# Altium footprint library ESKDPcbLib.PcbLib: 608 footprints (part 31 of 38)
Each footprint in its own frame and in the unit in brackets; x right, y up, seen from the top. Pads: shape width x height; smd on the part's side, far side on the other; paste and mask are expansions set on the pad; w line width, h text height; cw(c..) or ccw(c..) is an arc to the next point about the centre after c.
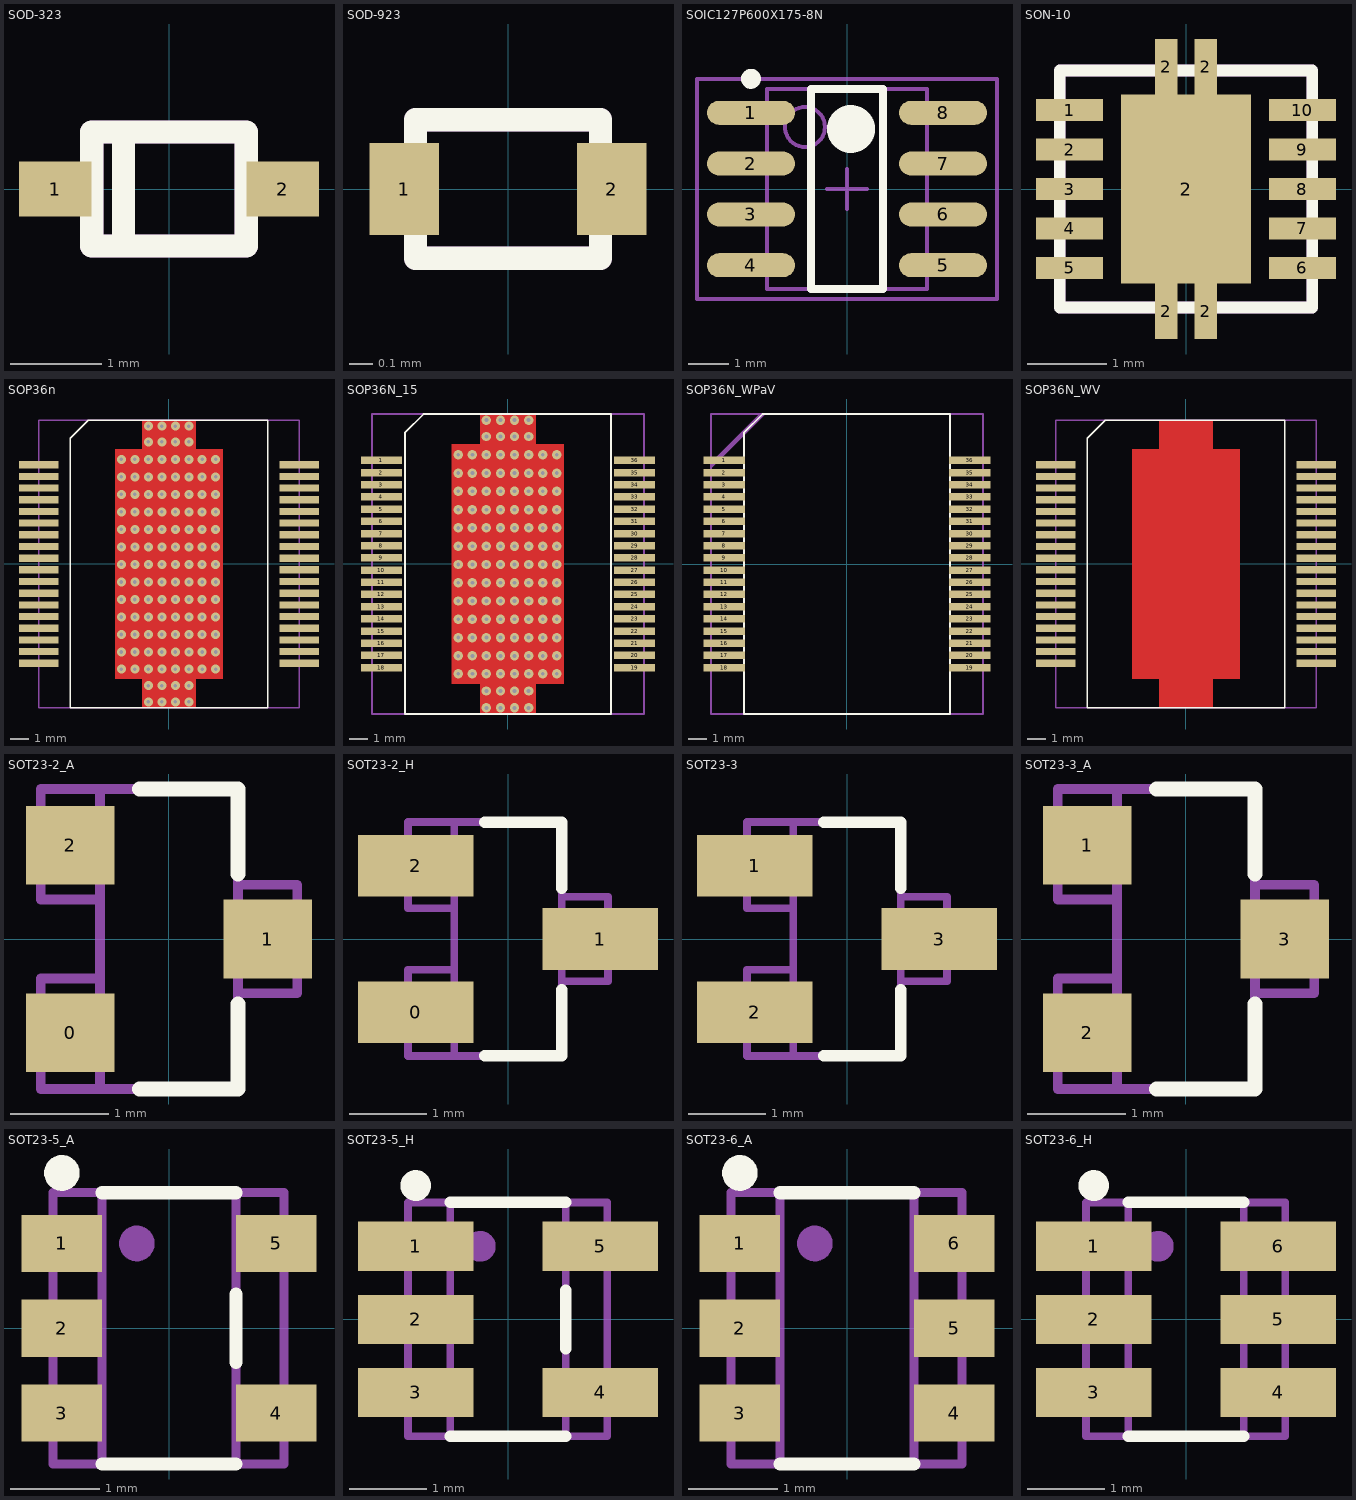
[diagram p30: the footprints below, top view; thin cyan lines are the x and y axes]

## SOD-323 [mm]
pads (2):
  rect 0.8x0.6 smd: 1(-1.25,0) 2(1.25,0)
Top Overlay:
  lines w0.254: -0.5,-0.625 -0.5,0.625 ; -0.85,-0.625 -0.85,0.625 0.85,0.625 0.85,-0.625 -0.85,-0.625
Mechanical 7:
  lines w0.254: -0.5,-0.625 -0.5,0.625 ; -0.85,-0.625 0.85,-0.625 0.85,0.625 -0.85,0.625 -0.85,-0.625
Mechanical 10:
  text ".Comment" at -0.575,0.95 h1.52
  text ".Designator" at -0.575,2.9 h1.52
3D body: height 1.1, standoff 0, extent -1.3,-0.675 1.3,0.675

## SOD-923 [mm]
pads (2):
  rect 0.3x0.4 smd: 1(-0.45,0) 2(0.45,0)
Top Overlay:
  lines w0.1: -0.4,-0.3 0.4,-0.3 0.4,0.3 -0.4,0.3 -0.4,-0.3
Mechanical 7:
  lines w0.1: -0.4,-0.3 0.4,-0.3 0.4,0.3 -0.4,0.3 -0.4,-0.3
3D body: height 0.4, standoff 0, extent -0.4,-0.3 0.4,0.3

## SOIC127P600X175-8N [mm] "SOIC, 8-Leads, Body 5,0x4,0mm (max), Pitch 1,27mm, IPC Medium Density"
height 1.75
pads (8):
  oval 2.2x0.6 smd: 1(-2.4,1.905) 2(-2.4,0.635) 3(-2.4,-0.635) 4(-2.4,-1.905) 5(2.4,-1.905) 6(2.4,-0.635) 7(2.4,0.635) 8(2.4,1.905)
Top Overlay:
  circle w0.25: c-2.4,2.755 r0.125
  circle w0.6: c0.1,1.5 r0.3
  lines w0.2: -0.9,-2.5 -0.9,2.5 0.9,2.5 0.9,-2.5 -0.9,-2.5
Mechanical 9:
  circle w0.1: c-1.05,1.55 r0.5
  lines w0.1: -2,-2.5 -2,2.5 2,2.5 2,-2.5 -2,-2.5
Mechanical 15:
  lines w0.1: -0.5,0 0.5,0 ; 0,-0.5 0,0.5 ; -3.75,-2.75 -3.75,2.75 3.75,2.75 3.75,-2.75 -3.75,-2.75
3D body: height 1.75, standoff 0.1, extent -2,-2.5 2,2.5

## SON-10 [mm]
pads (15):
  rect 0.85x0.28 smd: 1(-1.475,1) 2(-1.475,0.5) 3(-1.475,0) 4(-1.475,-0.5) 5(-1.475,-1) 6(1.475,-1) 7(1.475,-0.5) 8(1.475,0) 9(1.475,0.5) 10(1.475,1)
  rect 0.28x0.7 smd: 2(-0.25,-1.55) 2(-0.25,1.55) 2(0.25,-1.55) 2(0.25,1.55)
  rect 1.65x2.4 smd: 2(0,0)
Top Overlay:
  lines w0.15: -1.6,-1.5 -1.6,1.5 1.6,1.5 1.6,-1.5 -1.6,-1.5
Mechanical 7:
  lines w0.15: -1.6,-1.5 -1.6,1.5 1.6,1.5 1.6,-1.5 -1.6,-1.5
3D body: height 1, standoff 0.1, extent -1.55,-1.55 1.55,1.55

## SOP36n [mm]
pads (36):
  rect 2.2x0.4 smd: 1(-7.25,5.525) 2(-7.25,4.875) 3(-7.25,4.225) 4(-7.25,3.575) 5(-7.25,2.925) 6(-7.25,2.275) 7(-7.25,1.625) 8(-7.25,0.975) 9(-7.25,0.325) 10(-7.25,-0.325) 11(-7.25,-0.975) 12(-7.25,-1.625) 13(-7.25,-2.275) 14(-7.25,-2.925) 15(-7.25,-3.575) 16(-7.25,-4.225) 17(-7.25,-4.875) 18(-7.25,-5.525) 19(7.25,-5.525) 20(7.25,-4.875) 21(7.25,-4.225) 22(7.25,-3.575) 23(7.25,-2.925) 24(7.25,-2.275) 25(7.25,-1.625) 26(7.25,-0.975) 27(7.25,-0.325) 28(7.25,0.325) 29(7.25,0.975) 30(7.25,1.625) 31(7.25,2.275) 32(7.25,2.925) 33(7.25,3.575) 34(7.25,4.225) 35(7.25,4.875) 36(7.25,5.525)
via 2.6,-5.85 diameter 0.5 hole 0.2
via 1.85,-5.85 diameter 0.5 hole 0.2
via 2.6,-4.9 diameter 0.5 hole 0.2
via 1.85,-4.9 diameter 0.5 hole 0.2
via 2.6,-3.925 diameter 0.5 hole 0.2
via 1.85,-3.925 diameter 0.5 hole 0.2
via 2.6,-2.95 diameter 0.5 hole 0.2
via 1.85,-2.95 diameter 0.5 hole 0.2
via 2.6,-1.975 diameter 0.5 hole 0.2
via 1.85,-1.975 diameter 0.5 hole 0.2
via 2.6,-1 diameter 0.5 hole 0.2
via 1.85,-1 diameter 0.5 hole 0.2
via 2.6,-0.025 diameter 0.5 hole 0.2
via 1.85,-0.025 diameter 0.5 hole 0.2
via 2.6,0.95 diameter 0.5 hole 0.2
via 1.85,0.95 diameter 0.5 hole 0.2
via 2.6,1.925 diameter 0.5 hole 0.2
via 1.85,1.925 diameter 0.5 hole 0.2
via 2.6,2.9 diameter 0.5 hole 0.2
via 1.85,2.9 diameter 0.5 hole 0.2
via 2.6,3.875 diameter 0.5 hole 0.2
via 1.85,3.875 diameter 0.5 hole 0.2
via 2.6,4.85 diameter 0.5 hole 0.2
via 1.85,4.85 diameter 0.5 hole 0.2
via 2.6,5.825 diameter 0.5 hole 0.2
via 1.85,5.825 diameter 0.5 hole 0.2
via -1.9,-5.85 diameter 0.5 hole 0.2
via -2.65,-5.85 diameter 0.5 hole 0.2
via -1.9,-4.9 diameter 0.5 hole 0.2
via -2.65,-4.9 diameter 0.5 hole 0.2
via -1.9,-3.925 diameter 0.5 hole 0.2
via -2.65,-3.925 diameter 0.5 hole 0.2
via -1.9,-2.95 diameter 0.5 hole 0.2
via -2.65,-2.95 diameter 0.5 hole 0.2
via -1.9,-1.975 diameter 0.5 hole 0.2
via -2.65,-1.975 diameter 0.5 hole 0.2
via -1.9,-1 diameter 0.5 hole 0.2
via -2.65,-1 diameter 0.5 hole 0.2
via -1.9,-0.025 diameter 0.5 hole 0.2
via -2.65,-0.025 diameter 0.5 hole 0.2
via -1.9,0.95 diameter 0.5 hole 0.2
via -2.65,0.95 diameter 0.5 hole 0.2
via -1.9,1.925 diameter 0.5 hole 0.2
via -2.65,1.925 diameter 0.5 hole 0.2
via -1.9,2.9 diameter 0.5 hole 0.2
via -2.65,2.9 diameter 0.5 hole 0.2
via -1.9,3.875 diameter 0.5 hole 0.2
via -2.65,3.875 diameter 0.5 hole 0.2
via -1.9,4.85 diameter 0.5 hole 0.2
via -2.65,4.85 diameter 0.5 hole 0.2
via -1.9,5.825 diameter 0.5 hole 0.2
via -2.65,5.825 diameter 0.5 hole 0.2
via 1.1,-7.675 diameter 0.5 hole 0.2
via 0.35,-7.675 diameter 0.5 hole 0.2
via -0.4,-7.675 diameter 0.5 hole 0.2
via -1.15,-7.675 diameter 0.5 hole 0.2
via 1.1,-6.775 diameter 0.5 hole 0.2
via 0.35,-6.775 diameter 0.5 hole 0.2
via -0.4,-6.775 diameter 0.5 hole 0.2
via -1.15,-6.775 diameter 0.5 hole 0.2
via -1.15,6.8 diameter 0.5 hole 0.2
via -0.4,6.8 diameter 0.5 hole 0.2
via 0.35,6.8 diameter 0.5 hole 0.2
via 1.1,6.8 diameter 0.5 hole 0.2
via -1.15,5.825 diameter 0.5 hole 0.2
via -0.4,5.825 diameter 0.5 hole 0.2
via 0.35,5.825 diameter 0.5 hole 0.2
via 1.1,5.825 diameter 0.5 hole 0.2
via -1.15,4.85 diameter 0.5 hole 0.2
via -0.4,4.85 diameter 0.5 hole 0.2
via 0.35,4.85 diameter 0.5 hole 0.2
via 1.1,4.85 diameter 0.5 hole 0.2
via -1.15,3.875 diameter 0.5 hole 0.2
via -0.4,3.875 diameter 0.5 hole 0.2
via 0.35,3.875 diameter 0.5 hole 0.2
via 1.1,3.875 diameter 0.5 hole 0.2
via -1.15,2.9 diameter 0.5 hole 0.2
via -0.4,2.9 diameter 0.5 hole 0.2
via 0.35,2.9 diameter 0.5 hole 0.2
via 1.1,2.9 diameter 0.5 hole 0.2
via -1.15,1.925 diameter 0.5 hole 0.2
via -0.4,1.925 diameter 0.5 hole 0.2
via 0.35,1.925 diameter 0.5 hole 0.2
via 1.1,1.925 diameter 0.5 hole 0.2
via -1.15,0.95 diameter 0.5 hole 0.2
via -0.4,0.95 diameter 0.5 hole 0.2
via 0.35,0.95 diameter 0.5 hole 0.2
via 1.1,0.95 diameter 0.5 hole 0.2
via -1.15,-0.025 diameter 0.5 hole 0.2
via -0.4,-0.025 diameter 0.5 hole 0.2
via 0.35,-0.025 diameter 0.5 hole 0.2
via 1.1,-0.025 diameter 0.5 hole 0.2
via -1.15,-1 diameter 0.5 hole 0.2
via -0.4,-1 diameter 0.5 hole 0.2
via 0.35,-1 diameter 0.5 hole 0.2
via 1.1,-1 diameter 0.5 hole 0.2
via -1.15,-1.975 diameter 0.5 hole 0.2
via -0.4,-1.975 diameter 0.5 hole 0.2
via 0.35,-1.975 diameter 0.5 hole 0.2
via 1.1,-1.975 diameter 0.5 hole 0.2
via -1.15,-2.95 diameter 0.5 hole 0.2
via -0.4,-2.95 diameter 0.5 hole 0.2
via 0.35,-2.95 diameter 0.5 hole 0.2
via 1.1,-2.95 diameter 0.5 hole 0.2
via -1.15,-3.925 diameter 0.5 hole 0.2
via -0.4,-3.925 diameter 0.5 hole 0.2
via 0.35,-3.925 diameter 0.5 hole 0.2
via 1.1,-3.925 diameter 0.5 hole 0.2
via -1.15,-4.9 diameter 0.5 hole 0.2
via -0.4,-4.9 diameter 0.5 hole 0.2
via 0.35,-4.9 diameter 0.5 hole 0.2
via 1.1,-4.9 diameter 0.5 hole 0.2
via -1.15,-5.85 diameter 0.5 hole 0.2
via -0.4,-5.85 diameter 0.5 hole 0.2
via 0.35,-5.85 diameter 0.5 hole 0.2
via 1.1,-5.85 diameter 0.5 hole 0.2
via 1.1,7.675 diameter 0.5 hole 0.2
via 0.35,7.675 diameter 0.5 hole 0.2
via -0.4,7.675 diameter 0.5 hole 0.2
via -1.15,7.675 diameter 0.5 hole 0.2
Top Layer:
  rectangle: -1.5,-8 1.5,-6.4
  rectangle: -1.5,6.4 1.5,8
  rectangle: -3,-6.4 3,6.4
Top Overlay:
  lines w0.1: -5.5,-8 5.5,-8 5.5,8 -4.5,8 -5.5,7 -5.5,-8
Mechanical 7:
  lines w0.1: -7.25,-8 7.25,-8 7.25,8 -7.25,8 -7.25,-8
Mechanical 10:
  text ".Comment" at -1.527,8.85 h0.7
  text ".Designator" at -1.4,-9.1 h0.7
3D body: height 3.6, standoff 0, extent -5.525,-8 5.5,8
3D body: height 2, standoff 0, extent -7.25,-5.825 -5.5,5.725
3D body: height 2, standoff 0, extent 5.5,-5.825 7.25,5.725

## SOP36N_15 [mm]
pads (36):
  rect 2.2x0.4 smd: 1(-6.75,5.525) 2(-6.75,4.875) 3(-6.75,4.225) 4(-6.75,3.575) 5(-6.75,2.925) 6(-6.75,2.275) 7(-6.75,1.625) 8(-6.75,0.975) 9(-6.75,0.325) 10(-6.75,-0.325) 11(-6.75,-0.975) 12(-6.75,-1.625) 13(-6.75,-2.275) 14(-6.75,-2.925) 15(-6.75,-3.575) 16(-6.75,-4.225) 17(-6.75,-4.875) 18(-6.75,-5.525) 19(6.75,-5.525) 20(6.75,-4.875) 21(6.75,-4.225) 22(6.75,-3.575) 23(6.75,-2.925) 24(6.75,-2.275) 25(6.75,-1.625) 26(6.75,-0.975) 27(6.75,-0.325) 28(6.75,0.325) 29(6.75,0.975) 30(6.75,1.625) 31(6.75,2.275) 32(6.75,2.925) 33(6.75,3.575) 34(6.75,4.225) 35(6.75,4.875) 36(6.75,5.525)
via -1.15,7.675 diameter 0.5 hole 0.2
via -0.4,7.675 diameter 0.5 hole 0.2
via 0.35,7.675 diameter 0.5 hole 0.2
via 1.1,7.675 diameter 0.5 hole 0.2
via 1.1,-5.85 diameter 0.5 hole 0.2
via 0.35,-5.85 diameter 0.5 hole 0.2
via -0.4,-5.85 diameter 0.5 hole 0.2
via -1.15,-5.85 diameter 0.5 hole 0.2
via 1.1,-4.9 diameter 0.5 hole 0.2
via 0.35,-4.9 diameter 0.5 hole 0.2
via -0.4,-4.9 diameter 0.5 hole 0.2
via -1.15,-4.9 diameter 0.5 hole 0.2
via 1.1,-3.925 diameter 0.5 hole 0.2
via 0.35,-3.925 diameter 0.5 hole 0.2
via -0.4,-3.925 diameter 0.5 hole 0.2
via -1.15,-3.925 diameter 0.5 hole 0.2
via 1.1,-2.95 diameter 0.5 hole 0.2
via 0.35,-2.95 diameter 0.5 hole 0.2
via -0.4,-2.95 diameter 0.5 hole 0.2
via -1.15,-2.95 diameter 0.5 hole 0.2
via 1.1,-1.975 diameter 0.5 hole 0.2
via 0.35,-1.975 diameter 0.5 hole 0.2
via -0.4,-1.975 diameter 0.5 hole 0.2
via -1.15,-1.975 diameter 0.5 hole 0.2
via 1.1,-1 diameter 0.5 hole 0.2
via 0.35,-1 diameter 0.5 hole 0.2
via -0.4,-1 diameter 0.5 hole 0.2
via -1.15,-1 diameter 0.5 hole 0.2
via 1.1,-0.025 diameter 0.5 hole 0.2
via 0.35,-0.025 diameter 0.5 hole 0.2
via -0.4,-0.025 diameter 0.5 hole 0.2
via -1.15,-0.025 diameter 0.5 hole 0.2
via 1.1,0.95 diameter 0.5 hole 0.2
via 0.35,0.95 diameter 0.5 hole 0.2
via -0.4,0.95 diameter 0.5 hole 0.2
via -1.15,0.95 diameter 0.5 hole 0.2
via 1.1,1.925 diameter 0.5 hole 0.2
via 0.35,1.925 diameter 0.5 hole 0.2
via -0.4,1.925 diameter 0.5 hole 0.2
via -1.15,1.925 diameter 0.5 hole 0.2
via 1.1,2.9 diameter 0.5 hole 0.2
via 0.35,2.9 diameter 0.5 hole 0.2
via -0.4,2.9 diameter 0.5 hole 0.2
via -1.15,2.9 diameter 0.5 hole 0.2
via 1.1,3.875 diameter 0.5 hole 0.2
via 0.35,3.875 diameter 0.5 hole 0.2
via -0.4,3.875 diameter 0.5 hole 0.2
via -1.15,3.875 diameter 0.5 hole 0.2
via 1.1,4.85 diameter 0.5 hole 0.2
via 0.35,4.85 diameter 0.5 hole 0.2
via -0.4,4.85 diameter 0.5 hole 0.2
via -1.15,4.85 diameter 0.5 hole 0.2
via 1.1,5.825 diameter 0.5 hole 0.2
via 0.35,5.825 diameter 0.5 hole 0.2
via -0.4,5.825 diameter 0.5 hole 0.2
via -1.15,5.825 diameter 0.5 hole 0.2
via 1.1,6.8 diameter 0.5 hole 0.2
via 0.35,6.8 diameter 0.5 hole 0.2
via -0.4,6.8 diameter 0.5 hole 0.2
via -1.15,6.8 diameter 0.5 hole 0.2
via -1.15,-6.775 diameter 0.5 hole 0.2
via -0.4,-6.775 diameter 0.5 hole 0.2
via 0.35,-6.775 diameter 0.5 hole 0.2
via 1.1,-6.775 diameter 0.5 hole 0.2
via -1.15,-7.675 diameter 0.5 hole 0.2
via -0.4,-7.675 diameter 0.5 hole 0.2
via 0.35,-7.675 diameter 0.5 hole 0.2
via 1.1,-7.675 diameter 0.5 hole 0.2
via -2.65,5.825 diameter 0.5 hole 0.2
via -1.9,5.825 diameter 0.5 hole 0.2
via -2.65,4.85 diameter 0.5 hole 0.2
via -1.9,4.85 diameter 0.5 hole 0.2
via -2.65,3.875 diameter 0.5 hole 0.2
via -1.9,3.875 diameter 0.5 hole 0.2
via -2.65,2.9 diameter 0.5 hole 0.2
via -1.9,2.9 diameter 0.5 hole 0.2
via -2.65,1.925 diameter 0.5 hole 0.2
via -1.9,1.925 diameter 0.5 hole 0.2
via -2.65,0.95 diameter 0.5 hole 0.2
via -1.9,0.95 diameter 0.5 hole 0.2
via -2.65,-0.025 diameter 0.5 hole 0.2
via -1.9,-0.025 diameter 0.5 hole 0.2
via -2.65,-1 diameter 0.5 hole 0.2
via -1.9,-1 diameter 0.5 hole 0.2
via -2.65,-1.975 diameter 0.5 hole 0.2
via -1.9,-1.975 diameter 0.5 hole 0.2
via -2.65,-2.95 diameter 0.5 hole 0.2
via -1.9,-2.95 diameter 0.5 hole 0.2
via -2.65,-3.925 diameter 0.5 hole 0.2
via -1.9,-3.925 diameter 0.5 hole 0.2
via -2.65,-4.9 diameter 0.5 hole 0.2
via -1.9,-4.9 diameter 0.5 hole 0.2
via -2.65,-5.85 diameter 0.5 hole 0.2
via -1.9,-5.85 diameter 0.5 hole 0.2
via 1.85,5.825 diameter 0.5 hole 0.2
via 2.6,5.825 diameter 0.5 hole 0.2
via 1.85,4.85 diameter 0.5 hole 0.2
via 2.6,4.85 diameter 0.5 hole 0.2
via 1.85,3.875 diameter 0.5 hole 0.2
via 2.6,3.875 diameter 0.5 hole 0.2
via 1.85,2.9 diameter 0.5 hole 0.2
via 2.6,2.9 diameter 0.5 hole 0.2
via 1.85,1.925 diameter 0.5 hole 0.2
via 2.6,1.925 diameter 0.5 hole 0.2
via 1.85,0.95 diameter 0.5 hole 0.2
via 2.6,0.95 diameter 0.5 hole 0.2
via 1.85,-0.025 diameter 0.5 hole 0.2
via 2.6,-0.025 diameter 0.5 hole 0.2
via 1.85,-1 diameter 0.5 hole 0.2
via 2.6,-1 diameter 0.5 hole 0.2
via 1.85,-1.975 diameter 0.5 hole 0.2
via 2.6,-1.975 diameter 0.5 hole 0.2
via 1.85,-2.95 diameter 0.5 hole 0.2
via 2.6,-2.95 diameter 0.5 hole 0.2
via 1.85,-3.925 diameter 0.5 hole 0.2
via 2.6,-3.925 diameter 0.5 hole 0.2
via 1.85,-4.9 diameter 0.5 hole 0.2
via 2.6,-4.9 diameter 0.5 hole 0.2
via 1.85,-5.85 diameter 0.5 hole 0.2
via 2.6,-5.85 diameter 0.5 hole 0.2
Top Layer:
  rectangle: -3,-6.4 3,6.4
  rectangle: -1.5,6.4 1.5,8
  rectangle: -1.5,-8 1.5,-6.4
Top Overlay:
  lines w0.1: -5.5,-8 -5.5,7 -4.5,8 5.5,8 5.5,-8 -5.5,-8
Mechanical 7:
  lines w0.1: -7.25,-8 -7.25,8 7.25,8 7.25,-8 -7.25,-8
Mechanical 10:
  text ".Designator" at -1.4,-9.1 h0.7
  text ".Comment" at -1.527,8.85 h0.7
3D body: height 2, standoff 0, extent 5.5,-5.825 7.25,5.725
3D body: height 2, standoff 0, extent -7.25,-5.825 -5.5,5.725
3D body: height 3.6, standoff 0, extent -5.525,-8 5.5,8

## SOP36N_WPaV [mm]
pads (36):
  rect 2.2x0.4 smd: 1(-6.55,5.525) 2(-6.55,4.875) 3(-6.55,4.225) 4(-6.55,3.575) 5(-6.55,2.925) 6(-6.55,2.275) 7(-6.55,1.625) 8(-6.55,0.975) 9(-6.55,0.325) 10(-6.55,-0.325) 11(-6.55,-0.975) 12(-6.55,-1.625) 13(-6.55,-2.275) 14(-6.55,-2.925) 15(-6.55,-3.575) 16(-6.55,-4.225) 17(-6.55,-4.875) 18(-6.55,-5.525) 19(6.55,-5.525) 20(6.55,-4.875) 21(6.55,-4.225) 22(6.55,-3.575) 23(6.55,-2.925) 24(6.55,-2.275) 25(6.55,-1.625) 26(6.55,-0.975) 27(6.55,-0.325) 28(6.55,0.325) 29(6.55,0.975) 30(6.55,1.625) 31(6.55,2.275) 32(6.55,2.925) 33(6.55,3.575) 34(6.55,4.225) 35(6.55,4.875) 36(6.55,5.525)
Top Overlay:
  lines w0.1: -5.5,-8 -5.5,7 -4.5,8 5.5,8 5.5,-8 -5.5,-8
Mechanical 7:
  lines w0.1: -7.242,5.267 -4.517,7.992 ; -7.242,5.367 -4.63,7.98 ; -7.217,5.192 -4.417,7.992 ; -7.25,-8 -7.25,8 7.25,8 7.25,-8 -7.25,-8
Mechanical 10:
  text ".Designator" at -1.4,-9.1 h0.7
  text ".Comment" at -1.527,8.85 h0.7
3D body: height 2, standoff 0, extent 5.5,-5.825 7.25,5.725
3D body: height 2, standoff 0, extent -7.25,-5.825 -5.5,5.725
3D body: height 3.6, standoff 0, extent -5.525,-8 5.5,8

## SOP36N_WV [mm]
pads (36):
  rect 2.2x0.4 smd: 1(-7.25,5.525) 2(-7.25,4.875) 3(-7.25,4.225) 4(-7.25,3.575) 5(-7.25,2.925) 6(-7.25,2.275) 7(-7.25,1.625) 8(-7.25,0.975) 9(-7.25,0.325) 10(-7.25,-0.325) 11(-7.25,-0.975) 12(-7.25,-1.625) 13(-7.25,-2.275) 14(-7.25,-2.925) 15(-7.25,-3.575) 16(-7.25,-4.225) 17(-7.25,-4.875) 18(-7.25,-5.525) 19(7.25,-5.525) 20(7.25,-4.875) 21(7.25,-4.225) 22(7.25,-3.575) 23(7.25,-2.925) 24(7.25,-2.275) 25(7.25,-1.625) 26(7.25,-0.975) 27(7.25,-0.325) 28(7.25,0.325) 29(7.25,0.975) 30(7.25,1.625) 31(7.25,2.275) 32(7.25,2.925) 33(7.25,3.575) 34(7.25,4.225) 35(7.25,4.875) 36(7.25,5.525)
Top Layer:
  rectangle: -1.5,-8 1.5,-6.4
  rectangle: -1.5,6.4 1.5,8
  rectangle: -3,-6.4 3,6.4
Top Overlay:
  lines w0.1: -5.5,-8 5.5,-8 5.5,8 -4.5,8 -5.5,7 -5.5,-8
Mechanical 7:
  lines w0.1: -7.25,-8 7.25,-8 7.25,8 -7.25,8 -7.25,-8
Mechanical 10:
  text ".Comment" at -1.527,8.85 h0.7
  text ".Designator" at -1.4,-9.1 h0.7
3D body: height 3.6, standoff 0, extent -5.525,-8 5.5,8
3D body: height 2, standoff 0, extent -7.25,-5.825 -5.5,5.725
3D body: height 2, standoff 0, extent 5.5,-5.825 7.25,5.725

## SOT23-2_A [mm]
height 1.12
pads (3):
  rect 0.9x0.8 smd: 0(-1,-0.95) 1(1,0) 2(-1,0.95)
Top Overlay:
  lines w0.15: -0.3,-1.52 0.7,-1.52 0.7,-0.66 ; -0.3,1.52 0.7,1.52 0.7,0.66
Mechanical 7:
  lines w0.1: -0.7,-1.52 -0.7,1.52 ; -0.7,-0.4 -1.3,-0.4 -1.3,-1.52 0.7,-1.52 0.7,1.52 -1.3,1.52 -1.3,0.4 -0.7,0.4 ; 0.7,-0.55 1.3,-0.55 1.3,0.55 0.7,0.55
Mechanical 10:
  text ".Designator" at -0.71,1.79 h0.8
  text ".Comment" at -0.73,-2.2 h0.6
3D body: height 1.12, standoff 0, extent -0.7,-1.52 0.7,1.52
3D body: height 0.5, standoff 0, extent -1.3,0.4 -0.7,1.52
3D body: height 0.5, standoff 0, extent -1.3,-1.52 -0.7,-0.4
3D body: height 0.5, standoff 0, extent 0.7,-0.55 1.3,0.55

## SOT23-2_H [mm]
height 1.12
pads (3):
  rect 1.5x0.8 smd: 0(-1.2,-0.95) 1(1.2,0) 2(-1.2,0.95)
Top Overlay:
  lines w0.15: -0.3,-1.52 0.7,-1.52 0.7,-0.66 ; -0.3,1.52 0.7,1.52 0.7,0.66
Mechanical 7:
  lines w0.1: -0.7,-1.52 -0.7,1.52 ; -0.7,-0.4 -1.3,-0.4 -1.3,-1.52 0.7,-1.52 0.7,1.52 -1.3,1.52 -1.3,0.4 -0.7,0.4 ; 0.7,-0.55 1.3,-0.55 1.3,0.55 0.7,0.55
Mechanical 10:
  text ".Designator" at -0.71,1.79 h0.8
  text ".Comment" at -0.74,-2.17 h0.6
3D body: height 1.12, standoff 0, extent -0.7,-1.52 0.7,1.52
3D body: height 0.5, standoff 0, extent -1.3,0.4 -0.7,1.52
3D body: height 0.5, standoff 0, extent -1.3,-1.52 -0.7,-0.4
3D body: height 0.5, standoff 0, extent 0.7,-0.55 1.3,0.55

## SOT23-3 [mm]
height 1.12
pads (3):
  rect 1.5x0.8 smd: 1(-1.2,0.95) 2(-1.2,-0.95) 3(1.2,0)
Top Overlay:
  lines w0.15: -0.3,-1.52 0.7,-1.52 0.7,-0.66 ; -0.3,1.52 0.7,1.52 0.7,0.66
Mechanical 7:
  lines w0.1: -0.7,-1.52 -0.7,1.52 ; -0.7,-0.4 -1.3,-0.4 -1.3,-1.52 0.7,-1.52 0.7,1.52 -1.3,1.52 -1.3,0.4 -0.7,0.4 ; 0.7,-0.55 1.3,-0.55 1.3,0.55 0.7,0.55
Mechanical 10:
  text ".Designator" at -0.71,1.79 h0.8
  text ".Comment" at -0.74,-2.17 h0.6
3D body "SOT-23-3.STEP": height 1.1, standoff 0, extent -1.15,-1.5 1.15,1.5

## SOT23-3_A [mm]
height 1.12
pads (3):
  rect 0.9x0.8 smd: 1(-1,0.95) 2(-1,-0.95) 3(1,0)
Top Overlay:
  lines w0.15: -0.3,-1.52 0.7,-1.52 0.7,-0.66 ; -0.3,1.52 0.7,1.52 0.7,0.66
Mechanical 7:
  lines w0.1: -0.7,-1.52 -0.7,1.52 ; -0.7,-0.4 -1.3,-0.4 -1.3,-1.52 0.7,-1.52 0.7,1.52 -1.3,1.52 -1.3,0.4 -0.7,0.4 ; 0.7,-0.55 1.3,-0.55 1.3,0.55 0.7,0.55
Mechanical 10:
  text ".Comment" at -0.73,-2.2 h0.6
  text ".Designator" at -0.71,1.79 h0.8
3D body "SOT-23-3.STEP": height 1.1, standoff 0, extent -1.15,-1.5 1.15,1.5

## SOT23-5_A [mm]
height 1.12
pads (5):
  rect 0.9x0.64 smd: 1(-1.2,0.95) 2(-1.2,0) 3(-1.2,-0.95) 4(1.2,-0.95) 5(1.2,0.95)
Top Overlay:
  circle w0.2: c-1.2,1.74 r0.1
  lines w0.15: -0.75,-1.52 0.75,-1.52 ; -0.75,1.52 0.75,1.52 ; 0.75,-0.38 0.75,0.38
Mechanical 7:
  circle w0.2: c-0.36,0.95 r0.1
  lines w0.1: -0.75,-1.52 -0.75,1.52 ; 0.75,-1.52 0.75,1.52 ; -1.3,-1.52 -1.3,1.52 1.29,1.52 1.29,-1.52 -1.3,-1.52
Mechanical 10:
  text ".Designator" at -0.73,1.79 h0.8
  text ".Comment" at -0.79,-2.09 h0.6
3D body: height 0.5, standoff 0, extent -1.3,-1.52 -0.75,1.52
3D body: height 0.5, standoff 0, extent 0.75,-1.52 1.29,1.52
3D body: height 1.12, standoff 0, extent -0.75,-1.52 0.75,1.52

## SOT23-5_H [mm]
height 1.12
pads (5):
  rect 1.5x0.64 smd: 1(-1.2,0.95) 2(-1.2,0) 3(-1.2,-0.95) 4(1.2,-0.95) 5(1.2,0.95)
Top Overlay:
  circle w0.2: c-1.2,1.74 r0.1
  lines w0.15: -0.75,-1.52 0.75,-1.52 ; -0.75,1.52 0.75,1.52 ; 0.75,-0.38 0.75,0.38
Mechanical 7:
  circle w0.2: c-0.36,0.95 r0.1
  lines w0.1: -0.75,-1.52 -0.75,1.52 ; 0.75,-1.52 0.75,1.52 ; -1.3,-1.52 1.29,-1.52 1.29,1.52 -1.3,1.52 -1.3,-1.52
Mechanical 10:
  text ".Designator" at -0.73,1.79 h0.8
  text ".Comment" at -0.95,-2.13 h0.6
3D body: height 1.12, standoff 0, extent -0.75,-1.52 0.75,1.52
3D body: height 0.5, standoff 0, extent 0.75,-1.52 1.29,1.52
3D body: height 0.5, standoff 0, extent -1.3,-1.52 -0.75,1.52

## SOT23-6_A [mm]
height 1.12
pads (6):
  rect 0.9x0.64 smd: 1(-1.2,0.95) 2(-1.2,0) 3(-1.2,-0.95) 4(1.2,-0.95) 5(1.2,0) 6(1.2,0.95)
Top Overlay:
  circle w0.2: c-1.2,1.74 r0.1
  lines w0.15: -0.75,-1.52 0.75,-1.52 ; -0.75,1.52 0.75,1.52
Mechanical 7:
  circle w0.2: c-0.36,0.95 r0.1
  lines w0.1: -0.75,-1.52 -0.75,1.52 ; 0.75,-1.52 0.75,1.52 ; -1.3,-1.52 -1.3,1.52 1.29,1.52 1.29,-1.52 -1.3,-1.52
Mechanical 10:
  text ".Designator" at -0.45,2.725 h1
  text ".Comment" at -0.45,1.725 h1
3D body "SOT23-6.STEP": height 1, standoff -0.1, extent -1.196,-1.447 1.204,1.453

## SOT23-6_H [mm]
height 1.12
pads (6):
  rect 1.5x0.64 smd: 1(-1.2,0.95) 2(-1.2,0) 3(-1.2,-0.95) 4(1.2,-0.95) 5(1.2,0) 6(1.2,0.95)
Top Overlay:
  circle w0.2: c-1.2,1.74 r0.1
  lines w0.15: -0.75,-1.52 0.75,-1.52 ; -0.75,1.52 0.75,1.52
Mechanical 7:
  circle w0.2: c-0.36,0.95 r0.1
  lines w0.1: -0.75,-1.52 -0.75,1.52 ; 0.75,-1.52 0.75,1.52 ; -1.3,-1.52 1.29,-1.52 1.29,1.52 -1.3,1.52 -1.3,-1.52
Mechanical 10:
  text ".Designator" at -1.1,3 h1
  text ".Comment" at -1.1,2 h1
3D body "SOT23-6.STEP": height 1, standoff -0.1, extent -1.196,-1.446 1.204,1.454